# Altium footprint library Library.PcbLib: 308 footprints (part 14 of 21)
Each footprint in its own frame and in the unit in brackets; x right, y up, seen from the top. Pads: shape width x height; smd on the part's side, far side on the other; paste and mask are expansions set on the pad; w line width, h text height; cw(c..) or ccw(c..) is an arc to the next point about the centre after c.
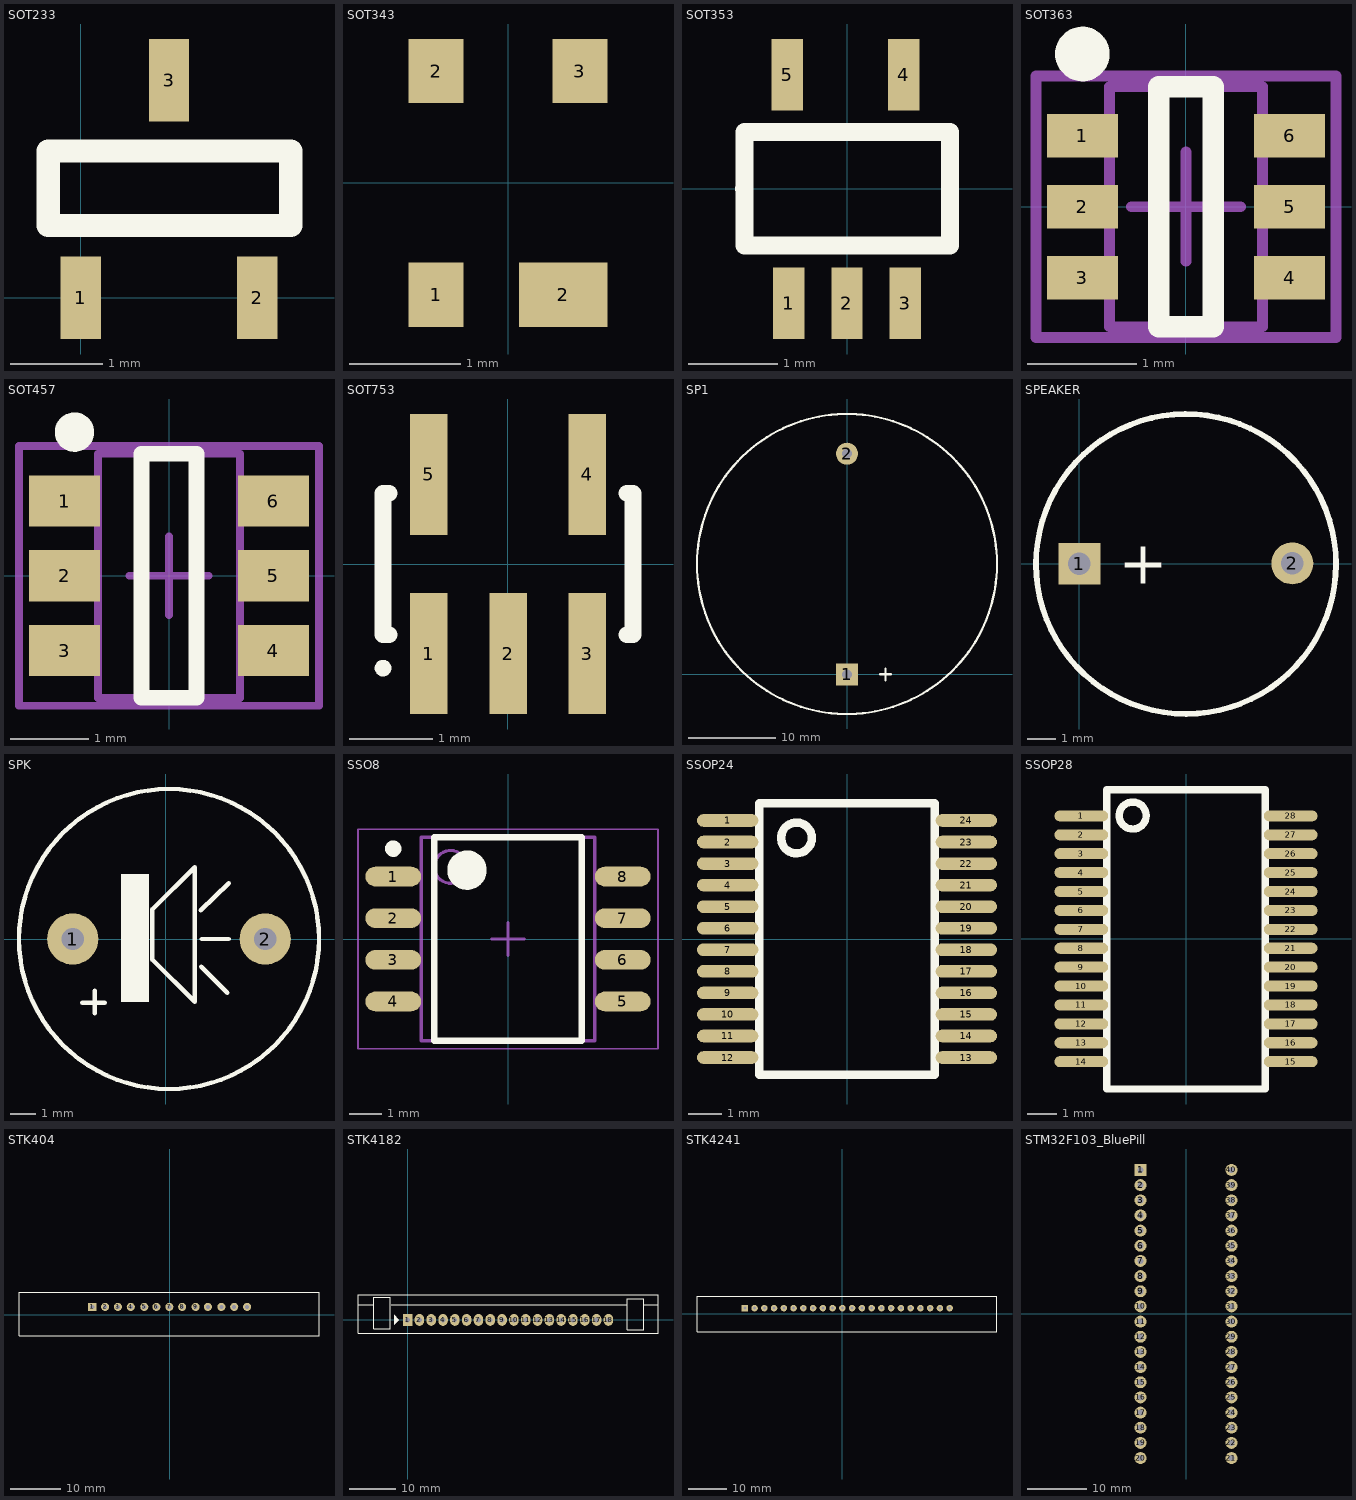
[diagram p13: the footprints below, top view; thin cyan lines are the x and y axes]

## SOT233 [mm]
pads (3):
  rect 0.44x0.9 smd: 1(0,0) 2(1.92,0) 3(0.96,2.37)
Top Overlay:
  lines w0.254: -0.356,0.787 2.286,0.787 2.286,1.6 -0.356,1.6 -0.356,0.787
3D body "User Library-SOT23-3.step": height 1.3, standoff 0, extent -0.434,-0.13 2.466,2.67

## SOT343 [mm]
height 1.1
pads (4):
  rect 0.5x0.58 smd: 1(-0.65,-1.01) 2(-0.65,1.01) 3(0.65,1.01)
  rect 0.8x0.58 smd: 2(0.5,-1.01)
3D body "User Library-SOT343-1.step": height 1, standoff 0, extent -1.1,-1.1 1.1,1.1

## SOT353 [mm] "SOT-353/SC-88A; 5 Leads; Body 2.2 x 2.2 mm, inc. leads (LxW max)"
height 1.1
pads (5):
  rect 0.35x0.8 smd: 1(-0.65,-1.276) 2(0,-1.276) 3(0.65,-1.276) 4(0.635,1.27) 5(-0.665,1.27)
Top Overlay:
  lines w0.2: -1.15,0 -1.143,0 -1.143,-0.635 1.15,-0.635 1.15,0.127 1.15,0.635 -1.143,0.635 -1.143,-0.254
3D body "User Library-SOT353-1.step": height 1.1, standoff 0, extent -1.1,-1.2 1.1,1.2

## SOT363 [mm] "SOT363, 6-Leads, Body 2x1.3mm, Pitch 0.65mm, Lead Span 2.1mm, IPC High Density"
height 1.1
pads (6):
  rect 0.65x0.4 smd: 1(-0.95,0.65) 2(-0.95,0) 3(-0.95,-0.65) 4(0.95,-0.65) 5(0.95,0) 6(0.95,0.65)
Top Overlay:
  circle w0.25: c-0.95,1.4 r0.125
  lines w0.2: -0.25,-1.1 0.25,-1.1 0.25,1.1 -0.25,1.1 -0.25,-1.1
Mechanical 13:
  lines w0.1: -0.7,-1.1 -0.7,1.1 0.7,1.1 0.7,-1.1 -0.7,-1.1
Mechanical 15:
  lines w0.1: -0.5,0 0.5,0 ; 0,-0.5 0,0.5 ; -1.375,-1.2 -1.375,1.2 1.375,1.2 1.375,-1.2 -1.375,-1.2
3D body "User Library-SOT363-2.step": height 1.1, standoff 0, extent -1.2,-1.1 1.2,1.1

## SOT457 [mm] "SOT23, 6-Leads, Body 2.9x1.5mm, Pitch 0.95mm, Lead Span 2.8mm, IPC High Density"
height 1.1
pads (6):
  rect 0.9x0.65 smd: 1(-1.327,0.95) 2(-1.327,0) 3(-1.327,-0.95) 4(1.327,-0.95) 5(1.327,0) 6(1.327,0.95)
Top Overlay:
  circle w0.25: c-1.2,1.825 r0.125
  lines w0.2: -0.35,-1.55 -0.35,1.55 0.35,1.55 0.35,-1.55 -0.35,-1.55
Mechanical 13:
  lines w0.1: -0.9,-1.55 0.9,-1.55 0.9,1.55 -0.9,1.55 -0.9,-1.55
Mechanical 15:
  lines w0.1: -0.5,0 0.5,0 ; 0,-0.5 0,0.5 ; -1.905,-1.65 1.905,-1.65 1.905,1.65 -1.905,1.65 -1.905,-1.65
3D body "User Library-SOT23-6.step": height 1.3, standoff 0, extent -1.5,-1.5 1.5,1.5

## SOT753 [mm] "SOT-23/SC-74A; 5 Leads; Body 3.1 x 3 mm, inc. leads (LxW max)"
height 1.1
pads (5):
  rect 0.45x1.45 smd: 1(-0.95,-1.075) 2(0,-1.075) 3(0.95,-1.075) 4(0.95,1.075) 5(-0.95,1.075)
Top Overlay:
  circle w0.1: c-1.5,-1.25 r0.05
  lines w0.2: -1.425,-0.85 -1.5,-0.85 -1.5,0.85 -1.425,0.85 ; 1.425,-0.85 1.5,-0.85 1.5,0.85 1.425,0.85
3D body "User Library-SOT753.step": height 1.1, standoff 0, extent -1.55,-1.5 1.55,1.5

## SP1 [mil] "Speaker Telphone on Broad"
height 3
pads (2):
  rect 100x100 hole 45: 1(0,0)
  round 100 hole 45: 2(0,1000)
Top Overlay:
  circle w10: c0,500 r680
  lines w10: 150,0 200,0 ; 174,-28 174,26
3D body "Sonitron-SCS-32 p10-DEFAULT.STEP": height 382.53, standoff -227.75, extent -666.7,-174.54 652.2,1144.36

## SPEAKER [mm]
pads (2):
  rect 1.5x1.5 hole 0.8: 1(0,0)
  round 1.5 hole 0.8: 2(7.62,0.013)
Top Overlay:
  lines w0.203: 7.724,3.67 ccw(c3.816,-0.008) 7.76,3.632
  text "+" at 1.41,-0.711 h1.52
3D body "User Library-Buzzer WST-1203UX.step": height 3.5, standoff -10.65, extent -2.204,-6 13.239,6

## SPK [mil] "Speaker Chip"
height 500
pads (2):
  round 80 hole 35: 1(-145,0) 2(155,0)
Top Overlay:
  circle w7: c5,0 r233.73
  rectangle: -70,-98 -26,101
  lines w7: -130,-99 -95,-99 ; -111,-116 -111,-81 ; 54.52,44.52 98,87 ; 55,-43 96,-84 ; 56,0 98,0 ; -21,-32 -21,46 45,112 45,-98 -21,-32
3D body "Sonitron-SCS-17 P10-DEFAULT.STEP": height 343.51, standoff -267.12, extent -366,-354.14 366.28,378.14

## SSO8 [mm] "SSOIC, 8-Leads, Body 6.20x5.30mm, Pitch 1.27mm, IPC Medium Density"
height 1.5
pads (8):
  oval 1.7x0.6 smd: 1(-3.5,1.905) 2(-3.5,0.635) 3(-3.5,-0.635) 4(-3.5,-1.905) 5(3.5,-1.905) 6(3.5,-0.635) 7(3.5,0.635) 8(3.5,1.905)
Top Overlay:
  circle w0.6: c-1.25,2.1 r0.3
  circle w0.25: c-3.5,2.755 r0.125
  lines w0.2: -2.25,-3.1 2.25,-3.1 2.25,3.1 -2.25,3.1 -2.25,-3.1
Mechanical 13:
  circle w0.1: c-1.75,2.2 r0.5
  lines w0.1: -2.65,-3.1 2.65,-3.1 2.65,3.1 -2.65,3.1 -2.65,-3.1
Mechanical 15:
  lines w0.05: -4.575,-3.35 4.575,-3.35 4.575,3.35 -4.575,3.35 -4.575,-3.35
  lines w0.1: -0.5,0 0.5,0 ; 0,-0.5 0,0.5
3D body "SOIC127P760X150-8N.step": height 1.5, standoff 0, extent -3.81,-3.1 3.81,3.1

## SSOP24 [mm] "SSOP-24P-pitch 0.65"
pads (24):
  oval 1.85x0.38 smd: 1(-3.6,3.575) 2(-3.6,2.925) 3(-3.6,2.275) 4(-3.6,1.625) 5(-3.6,0.975) 6(-3.6,0.325) 7(-3.6,-0.325) 8(-3.6,-0.975) 9(-3.6,-1.625) 10(-3.6,-2.275) 11(-3.6,-2.925) 12(-3.6,-3.575) 13(3.6,-3.575) 14(3.6,-2.925) 15(3.6,-2.275) 16(3.6,-1.625) 17(3.6,-0.975) 18(3.6,-0.325) 19(3.6,0.325) 20(3.6,0.975) 21(3.6,1.625) 22(3.6,2.275) 23(3.6,2.925) 24(3.6,3.575)
Top Overlay:
  circle w0.254: c-1.524,3.048 r0.464
  lines w0.254: -2.65,-4.1 2.65,-4.1 2.65,4.1 -2.65,4.1 -2.65,-4.1
3D body "SSOP-24_5.3x8.2mm_P0.65mm.step": height 2.1, standoff 0, extent -3.9,-4.1 3.9,4.1

## SSOP28 [mm]
pads (28):
  oval 1.85x0.38 smd: 1(-3.6,4.225) 2(-3.6,3.575) 3(-3.6,2.925) 4(-3.6,2.275) 5(-3.6,1.625) 6(-3.6,0.975) 7(-3.6,0.325) 8(-3.6,-0.325) 9(-3.6,-0.975) 10(-3.6,-1.625) 11(-3.6,-2.275) 12(-3.6,-2.925) 13(-3.6,-3.575) 14(-3.6,-4.225) 15(3.6,-4.225) 16(3.6,-3.575) 17(3.6,-2.925) 18(3.6,-2.275) 19(3.6,-1.625) 20(3.6,-0.975) 21(3.6,-0.325) 22(3.6,0.325) 23(3.6,0.975) 24(3.6,1.625) 25(3.6,2.275) 26(3.6,2.925) 27(3.6,3.575) 28(3.6,4.225)
Top Overlay:
  circle w0.254: c-1.834,4.237 r0.464
  lines w0.254: -2.731,-5.165 2.731,-5.165 2.731,5.128 -2.731,5.128 -2.731,-5.165
3D body "User Library-SSOP-28-1.step": height 2.15, standoff 0, extent -3.878,-5.165 3.878,5.165

## STK404 [mm]
pads (13):
  rect 1.6x1.6 hole 0.8: 1(-15.367,1.524)
  round 1.6 hole 0.8: 2(-12.827,1.524) 3(-10.287,1.524) 4(-7.747,1.524) 5(-5.08,1.524) 6(-2.667,1.524) 7(-0.127,1.524) 8(2.413,1.524) 9(5.08,1.524) 10(7.493,1.524) 11(10.16,1.524) 12(12.7,1.524) 13(15.24,1.524)
Top Overlay:
  lines w0.2: -29.845,-4.191 -29.845,4.445 -26.543,4.445 29.464,4.445 29.464,-4.191 -29.845,-4.191
3D body: height 45, standoff 43, extent -44.45,10.058 48.26,44.45
3D body: height 38, standoff 36, extent -44.45,10.058 48.26,44.45
3D body: height 31, standoff 29, extent -44.45,10.058 48.26,44.45
3D body: height 66, standoff 64, extent -44.45,10.058 48.26,44.45
3D body: height 73, standoff 71, extent -44.45,10.058 48.26,44.45
3D body: height 59, standoff 57, extent -44.45,10.058 48.26,44.45
3D body: height 81, standoff 78, extent -44.45,10.058 48.26,44.45
3D body: height 24, standoff 22, extent -44.45,10.058 48.26,44.45
3D body: height 52, standoff 50, extent -44.45,10.058 48.26,44.45
3D body: height 10, standoff 8, extent -44.45,10.058 48.26,44.45
3D body: height 17, standoff 15, extent -44.45,10.058 48.26,44.45
3D body: height 3, standoff 0, extent -44.45,10.058 48.26,44.45
3D body: height 81, standoff 0, extent -44.45,4.572 48.26,10.058
3D body "User Library-STK404-130S.step": height 1.9, standoff -34.01, extent -29.727,-4.115 29.473,4.445

## STK4182 [mil] "Pin to pin 100mil, 18 pin"
pads (18):
  rect 80x100 hole 40: 1(0,0)
  oval 80x100 hole 40: 2(100,0) 3(200,0) 4(300,0) 5(400,0) 6(500,0) 7(600,0) 8(700,0) 9(800,0) 10(900,0) 11(1000,0) 12(1100,0) 13(1200,0) 14(1300,0) 15(1400,0) 16(1500,0) 17(1600,0) 18(1700,0)
Top Overlay:
  region: -115,42.5 -115,-42.5 -75,-2.5 -75,2.5
  lines w10: -420,130 -285,130 ; -140,130 1860,130 ; 2000,130 2120,130 ; -420,-115 2120,-115 2120,215 -420,215 -420,-115 ; -285,-75 -285,190 -145,190 -145,-75 -285,-75 ; 1860,-85 2000,-85 2000,180 1860,180 1860,-85

## STK4241 [mm]
pads (22):
  rect 1.7x1.7 hole 0.8: 1(-25.4,1.397)
  round 1.7 hole 0.8: 2(-22.86,1.397) 3(-20.32,1.397) 4(-17.78,1.397) 5(-15.24,1.397) 6(-12.7,1.397) 7(-10.16,1.397) 8(-7.62,1.397) 9(-5.08,1.397) 10(-2.54,1.397) 11(0,1.397) 12(2.54,1.397) 13(5.08,1.397) 14(7.62,1.397) 15(10.16,1.397) 16(12.7,1.397) 17(15.24,1.397) 18(17.78,1.397) 19(20.32,1.397) 20(22.86,1.397) 21(25.4,1.397) 22(27.94,1.397)
Top Overlay:
  lines w0.2: -37.846,-4.699 -37.846,4.445 -26.543,4.445 40.259,4.445 40.259,-4.699 -37.846,-4.699
3D body: height 45, standoff 43, extent -44.45,10.058 48.26,44.45
3D body: height 38, standoff 36, extent -44.45,10.058 48.26,44.45
3D body: height 31, standoff 29, extent -44.45,10.058 48.26,44.45
3D body: height 66, standoff 64, extent -44.45,10.058 48.26,44.45
3D body: height 73, standoff 71, extent -44.45,10.058 48.26,44.45
3D body: height 59, standoff 57, extent -44.45,10.058 48.26,44.45
3D body: height 81, standoff 78, extent -44.45,10.058 48.26,44.45
3D body: height 24, standoff 22, extent -44.45,10.058 48.26,44.45
3D body: height 52, standoff 50, extent -44.45,10.058 48.26,44.45
3D body: height 10, standoff 8, extent -44.45,10.058 48.26,44.45
3D body: height 17, standoff 15, extent -44.45,10.058 48.26,44.45
3D body: height 3, standoff 0, extent -44.45,10.058 48.26,44.45
3D body: height 81, standoff 0, extent -44.45,4.572 48.26,10.058
3D body "User Library-STK 4241V.step": height 3.5, standoff -56, extent -37.73,-4.677 40.27,4.373

## STM32F103_BluePill [mm]
pads (40):
  rect 2x2 hole 1.02: 1(-7.62,24.13)
  round 2 hole 1.02: 2(-7.62,21.59) 3(-7.62,19.05) 4(-7.62,16.51) 5(-7.62,13.97) 6(-7.62,11.43) 7(-7.62,8.89) 8(-7.62,6.35) 9(-7.62,3.81) 10(-7.62,1.27) 11(-7.62,-1.27) 12(-7.62,-3.81) 13(-7.62,-6.35) 14(-7.62,-8.89) 15(-7.62,-11.43) 16(-7.62,-13.97) 17(-7.62,-16.51) 18(-7.62,-19.05) 19(-7.62,-21.59) 20(-7.62,-24.13) 21(7.62,-24.13) 22(7.62,-21.59) 23(7.62,-19.05) 24(7.62,-16.51) 25(7.62,-13.97) 26(7.62,-11.43) 27(7.62,-8.89) 28(7.62,-6.35) 29(7.62,-3.81) 30(7.62,-1.27) 31(7.62,1.27) 32(7.62,3.81) 33(7.62,6.35) 34(7.62,8.89) 35(7.62,11.43) 36(7.62,13.97) 37(7.62,16.51) 38(7.62,19.05) 39(7.62,21.59) 40(7.62,24.13)
3D body "61302011821.stp": height 8.51, standoff -3.09, extent 6.37,-25.65 8.87,25.65
3D body "61302011821.stp": height 8.51, standoff -3.09, extent -8.87,-25.65 -6.37,25.65
3D body "Blue Pill STM32.step": height 22, standoff 1.9, extent -11.407,-27.16 11.453,31.261